# Altium footprint library Semicon-Discrete.pcblib: 205 footprints (part 4 of 13)
Each footprint in its own frame and in the unit in brackets; x right, y up, seen from the top. Pads: shape width x height; smd on the part's side, far side on the other; paste and mask are expansions set on the pad; w line width, h text height; cw(c..) or ccw(c..) is an arc to the next point about the centre after c.
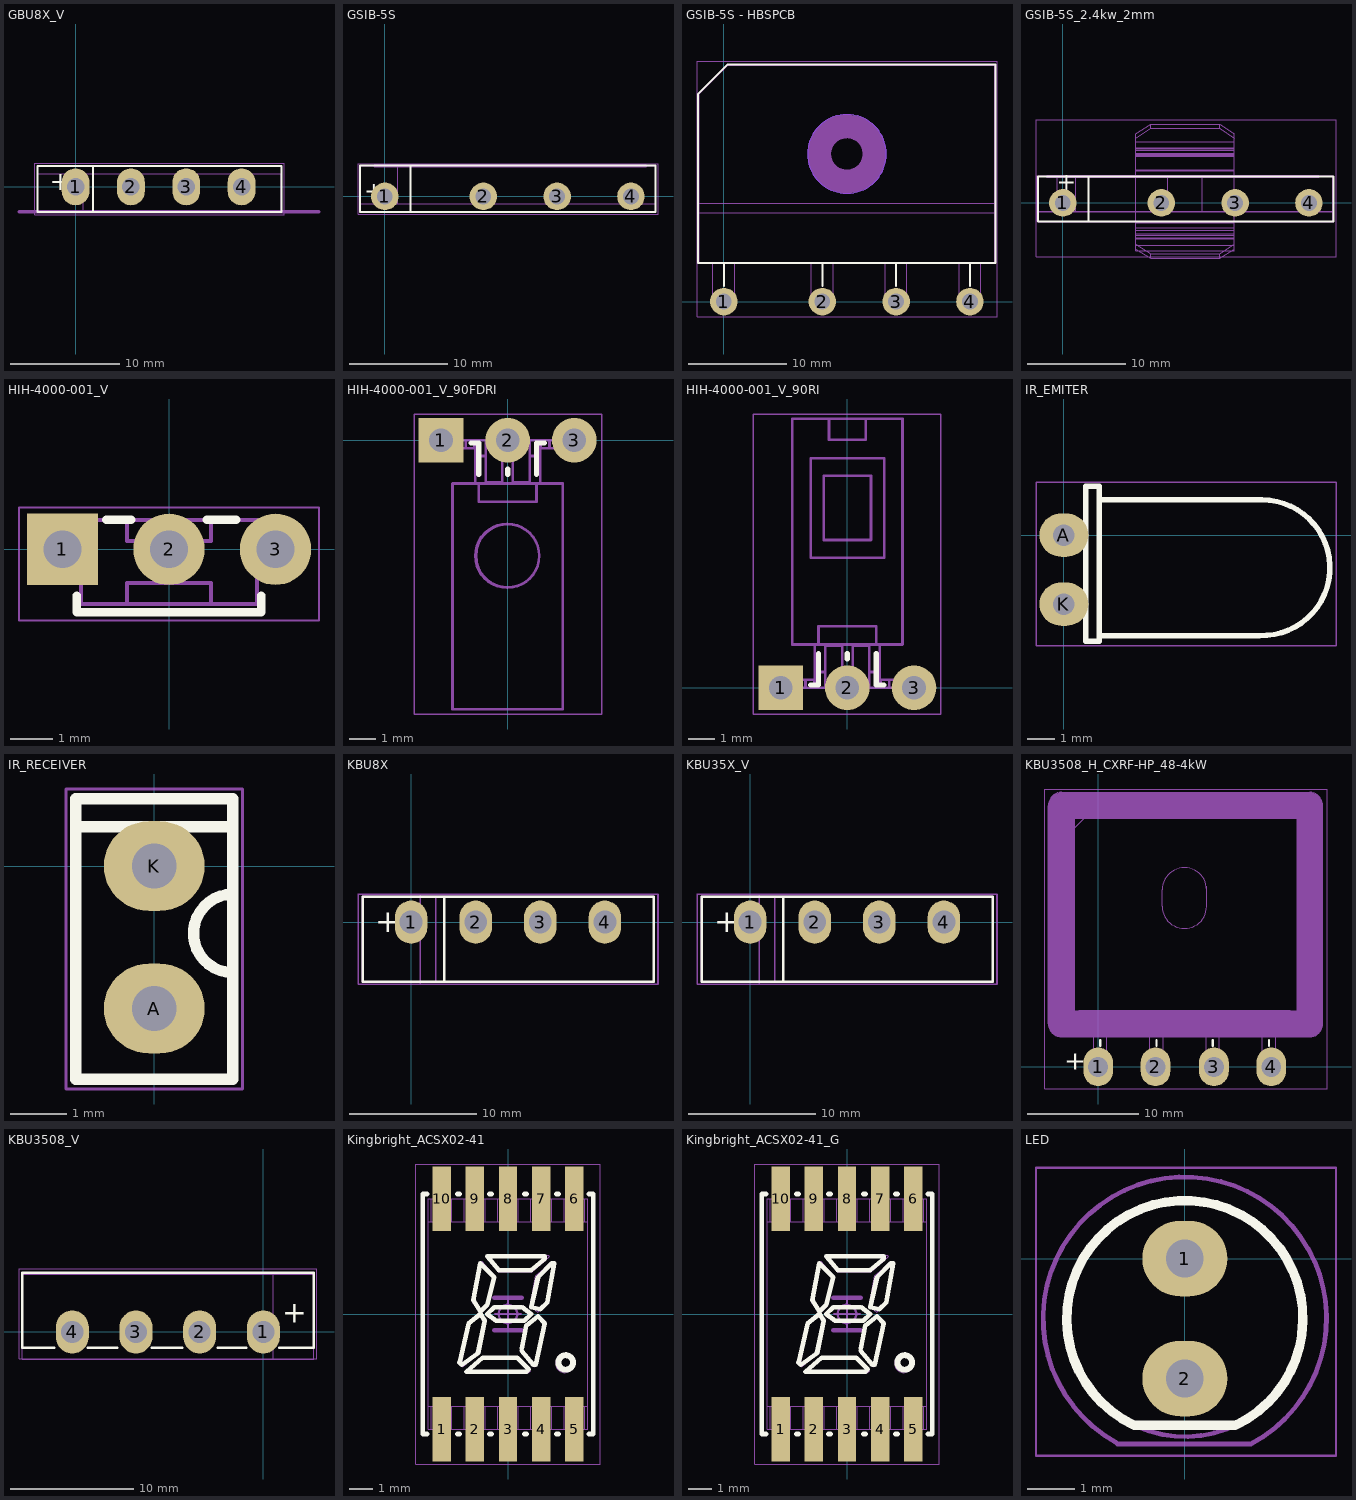
[diagram p3: the footprints below, top view; thin cyan lines are the x and y axes]

## GBU8X_V [mm]
height 20
pads (4):
  oval 2.55x3.4 hole 1.6: 1(0,0) 2(5.08,0) 3(10.16,0) 4(15.24,0)
TopOverlay:
  lines w0.2: 1.6,-2.3 1.6,1.8 ; -3.5,-2.3 -3.5,1.9 18.9,1.9 18.9,-2.3 -3.5,-2.3
  text "+" at -2.375,-0.925 h3
2-TopCompOutl:
  lines w0.1: 0.7,-2.3 0.7,1.2 ; -3.5,-2.3 18.9,-2.3 18.9,1.2 -3.5,1.2 -3.5,-2.3
4-TopCourty:
  circle w0.1: c0,0 r0.35
  lines w0.05: -3.75,-2.55 19.15,-2.55 19.15,2.15 -3.75,2.15 -3.75,-2.55
  lines w0.1: -0.525,0 0.525,0 ; 0,-0.525 0,0.525
5-MCadOutl:
  lines w0.3: -5.2,-2.3 22.35,-2.3
  text "heatsink side" at 2.8,-4.1 h2
7-TopAssy:
  lines w0.1: 0.7,-2.3 0.7,1.2 ; -3.5,-2.3 18.9,-2.3 18.9,1.2 -3.5,1.2 -3.5,-2.3 ; -0.4,-0.2 0.4,-0.2 0.4,0.2 -0.4,0.2 -0.4,-0.2 ; 4.68,-0.2 4.68,0.2 5.48,0.2 5.48,-0.2 4.68,-0.2 ; 9.76,-0.2 9.76,0.2 10.56,0.2 10.56,-0.2 9.76,-0.2 ; 14.84,-0.2 14.84,0.2 15.64,0.2 15.64,-0.2 14.84,-0.2
  text "+" at -2.375,-0.925 h3
  text ".Designator" at 2.325,2.225 h2.2
3D body "GBU8X_V.STEP": height 27.5, standoff -3, extent -3.575,-2.325 18.725,1.335

## GSIB-5S [mm]
pads (4):
  round 2.8 hole 1.6: 1(0,0) 2(10,0) 3(17.5,0) 4(25,0)
TopOverlay:
  lines w0.2: 2.6,-1.6 2.6,3.1 ; -2.5,-1.6 -2.5,3.125 27.5,3.125 27.5,-1.6 -2.5,-1.6
  text "+" at -2.075,-0.9 h3
2-TopCompOutl:
  lines w0.1: -2.5,-0.75 27.5,-0.75 27.5,-0.575 ; 1.3,-0.75 1.3,3.125 ; -2.5,-1.575 27.5,-1.575 27.5,3.125 -2.5,3.125 -2.5,0.425 -2.5,-1.575
4-TopCourty:
  circle w0.1: c0,0 r0.35
  lines w0.05: -2.725,-1.825 -2.725,3.325 27.75,3.325 27.75,-1.825 -2.725,-1.825
  lines w0.1: -0.525,0 0.525,0 ; 0,-0.525 0,0.525
5-MCadOutl:
  lines w0.3: -1.025,3.1 26.525,3.1
  text "heatsink side" at 18.525,4.9 h2
7-TopAssy:
  circle w0.1: c25,0 r0.6
  circle w0.1: c17.5,0 r0.6
  circle w0.1: c10,0 r0.6
  circle w0.1: c0,0 r0.6
  lines w0.1: -2.5,-0.75 27.5,-0.75 27.5,-1 ; 1.3,-0.725 1.3,3.125 ; -2.5,-1.6 27.5,-1.6 27.5,3.125 -2.5,3.125 -2.5,0 -2.5,-1.6
  text ".Designator" at 1.825,0.875 h1.8
  text "+" at -1.9,0.45 h3
3D body "GSIB-5S.STEP": height 24, standoff -3.2, extent -2.4,-1.5 27.6,3.1

## GSIB-5S - HBSPCB [mm] "Bridge 15A 800V Horisontaly mounted on the back side of the PCB"
height 6.4
pads (4):
  round 2.8 hole 1.6: 1(0,0) 2(10,0) 3(17.5,0) 4(25,0)
TopLayer keep-out:
  circle w0.1: c12.5,15 r4
BottomLayer keep-out:
  circle w0.1: c12.5,15 r4
TopOverlay:
  lines w0.2: 0,1.6 0,3.9 ; 10,1.6 10,3.9 ; 17.5,1.6 17.5,3.9 ; 25,1.6 25,3.9 ; -2.6,3.9 27.6,3.9 27.6,24.1 0.4,24.1 -2.6,21.1 -2.6,3.9
1-RoutNonPlating:
  circle w2.4: c12.5,15 r2.8
2-TopCompOutl:
  circle w0.1: c12.5,15 r1.8
  lines w0.1: -2.5,9 27.5,9 ; -2.5,10 27.5,10 ; -1.1,4 -1.1,0 -0.5,0 ; 0.5,0 1.1,0 1.1,4 ; 8.9,4 8.9,0 9.5,0 ; 10.5,0 11.1,0 11.1,4 ; 16.4,4 16.4,0 17,0 ; 18,0 18.6,0 18.6,4 ; 23.9,4 23.9,0 24.5,0 ; 25.5,0 26.1,0 26.1,4 ; -2.5,4 -2.5,21.1 0.4,24 27.5,24 27.5,4 0,4 -2.5,4 ; -0.5,-0.3 0.5,-0.3 0.5,0.3 -0.5,0.3 -0.5,-0.3 ; 9.5,-0.3 10.5,-0.3 10.5,0.3 9.5,0.3 9.5,-0.3 ; 17,-0.3 18,-0.3 18,0.3 17,0.3 17,-0.3 ; 24.5,-0.3 25.5,-0.3 25.5,0.3 24.5,0.3 24.5,-0.3
4-TopCourty:
  circle w0.1: c0,0 r0.35
  lines w0.05: -2.725,-1.55 -2.725,24.425 27.75,24.425 27.75,-1.55 -2.725,-1.55
  lines w0.1: -0.525,0 0.525,0 ; 0,-0.525 0,0.525
7-TopAssy:
  circle w0.1: c12.5,15 r1.8
  lines w0.1: -2.5,9 27.5,9 ; -2.5,10 27.5,10 ; -1.1,4 -1.1,0 -0.5,0 ; 0.5,0 1.1,0 1.1,4 ; 8.9,4 8.9,0 9.5,0 ; 10.5,0 11.1,0 11.1,4 ; 16.4,4 16.4,0 17,0 ; 18,0 18.6,0 18.6,4 ; 23.9,4 23.9,0 24.5,0 ; 25.5,0 26.1,0 26.1,4 ; -2.5,4 0,4 27.5,4 27.5,24 0.4,24 -2.5,21.1 -2.5,4 ; -0.5,-0.3 -0.5,0.3 0.5,0.3 0.5,-0.3 -0.5,-0.3 ; 9.5,-0.3 9.5,0.3 10.5,0.3 10.5,-0.3 9.5,-0.3 ; 17,-0.3 17,0.3 18,0.3 18,-0.3 17,-0.3 ; 24.5,-0.3 24.5,0.3 25.5,0.3 25.5,-0.3 24.5,-0.3
  text ".Designator" at 6.775,6.125 h2.2
16-Mechanical16:
  circle w0.1: c0,0 r0.7
  circle w0.1: c10,0 r0.7
  circle w0.1: c17.5,0 r0.7
  circle w0.1: c25,0 r0.7
  circle w0.1: c12.5,15 r4

## GSIB-5S_2.4kw_2mm [mm] "GSIB-5S_2.4kw_2mm"
pads (4):
  round 2.8 hole 1.6: 1(0,0) 2(10,0) 3(17.5,0) 4(25,0)
TopOverlay:
  lines w0.2: 2.6,-1.9 2.6,2.7 ; -2.5,-1.9 -2.5,2.7 27.5,2.7 27.5,-1.9 -2.5,-1.9
  text "+" at -0.625,0.65 h3
2-TopCompOutl:
  lines w0.1: -2.5,-0.9 27.5,-0.9 27.5,-1 ; 1.3,-0.9 1.3,2.7 ; -2.5,-1.9 27.5,-1.9 27.5,2.7 -2.5,2.7 -2.5,0 -2.5,-1.9
4-TopCourty:
  circle w0.1: c0,0 r0.35
  lines w0.05: -2.725,-5.45 -2.725,8.45 27.75,8.45 27.75,-5.45 -2.725,-5.45
  lines w0.1: -0.525,0 0.525,0 ; 0,-0.525 0,0.525
5-MCadOutl:
  drawing of 195 lines, arcs and shapes, not listed
  text "heatsink side" at 28.025,4.275 h2
7-TopAssy:
  circle w0.1: c25,0 r0.6
  circle w0.1: c17.5,0 r0.6
  circle w0.1: c10,0 r0.6
  circle w0.1: c0,0 r0.6
  lines w0.1: -2.5,-0.9 27.5,-0.9 27.5,-1 ; 1.3,-0.9 1.3,2.7 ; -2.5,-1.9 27.5,-1.9 27.5,2.7 -2.5,2.7 -2.5,0 -2.5,-1.9
  text "+" at -0.65,0.675 h3
  text ".Designator" at 2.525,0.3 h2.2
3D body "GSIB-5S_2.4kw_2mm.STEP": height 29.51, standoff -3.2, extent -2.5,-5.34 27.5,8.3

## HIH-4000-001_V [mm] "Snsr, Humdy Cap, 100%, SIL, Verticall"
height 13
pads (3):
  rect 1.7x1.7 hole 0.9: 1(-2.54,0)
  round 1.7 hole 0.9: 2(0,0) 3(2.54,0)
TopOverlay:
  lines w0.2: -2.2,-1.1 -2.2,-1.5 2.2,-1.5 2.2,-1.1 ; -1.5,0.7 -0.9,0.7 ; 0.9,0.7 1.6,0.7
2-TopCompOutl:
  lines w0.1: -2.1,-0.2 -2.7,-0.2 -2.7,0.2 -2.1,0.2 ; -1,-1.3 -1,-0.8 1,-0.8 1,-1.3 ; -1,0.7 -1,0.2 1,0.2 1,0.7 ; 2.1,-0.2 2.7,-0.2 2.7,0.2 2.1,0.2 ; -2.1,-1.3 -2.1,0.7 2.1,0.7 2.1,-1.3 -2.1,-1.3
4-TopCourty:
  circle w0.1: c0,0 r0.35
  lines w0.05: -3.575,-1.7 -3.575,1 3.575,1 3.575,-1.7 -3.575,-1.7
  lines w0.1: -0.525,0 0.525,0 ; 0,-0.525 0,0.525
7-TopAssy:
  lines w0.1: -2.1,-0.2 -2.7,-0.2 -2.7,0.2 -2.1,0.2 ; -1,-1.3 -1,-0.8 1,-0.8 1,-1.3 ; -1,0.7 -1,0.2 1,0.2 1,0.7 ; 2.1,-0.2 2.7,-0.2 2.7,0.2 2.1,0.2 ; -2.1,-1.3 -2.1,0.7 2.1,0.7 2.1,-1.3 -2.1,-1.3
  text ".Designator" at -1.75,1.025 h2.2

## HIH-4000-001_V_90FDRI [mm] "Snsr, Humdy Cap, 100%, SIL, Horizontally Mounted"
height 13
pads (3):
  rect 1.7x1.7 hole 0.9: 1(-2.54,0)
  round 1.7 hole 0.9: 2(0,0) 3(2.54,0)
TopOverlay:
  lines w0.2: -1.4,-0.1 -1.1,-0.1 -1.1,-1.3 ; 0,-1.3 0,-1.1 ; 1.1,-1.3 1.1,-0.1 1.4,-0.1
2-TopCompOutl:
  circle w0.1: c-0.017,-4.4 r1.217
  lines w0.1: -1.24,-1.647 -1.24,-0.6 ; -1.24,-0.345 -1.253,-0.312 -1.266,-0.3 ; 1.24,-1.647 1.24,-0.6 ; 1.24,-0.345 1.253,-0.312 1.266,-0.3 ; -2.389,-0.3 -2.74,-0.3 -2.74,0 -2.389,0 ; -2.389,-0.3 -1.591,-0.3 ; -2.389,-0.3 -2.389,0 ; -2.389,0 -1.591,0 ; -1.591,-0.3 -1.591,0 ; -1.591,-0.3 -1.266,-0.3 ; -1.591,0 -1.266,0 ; -1.266,-0.3 -1.266,0 ; -1.266,0 cw(c-1.394,-0.086) -1.24,-0.091 -1.24,-0.6 ; -1.266,0 -0.843,0 -0.84,-0.011 -0.84,-0.6 ; -1.24,-0.6 -0.84,-0.6 ; -1.1,-1.647 1.1,-1.647 ; -1.1,-1.647 -1.1,-2.347 1.1,-2.347 1.1,-1.647 ; -1.1,-1.647 -2.1,-1.647 -2.1,-10.247 0.7,-10.247 2.1,-10.247 2.1,-1.647 1.1,-1.647 ; -0.84,-0.6 -0.84,-1.597 -0.2,-1.597 -0.2,-0.6 ; -0.2,-0.6 -0.2,0 0.2,0 0.2,-0.6 ; -0.2,-0.6 0.2,-0.6 ; 0.2,-0.6 0.2,-1.597 0.84,-1.597 0.84,-0.6 ; 0.84,-0.6 0.84,-0.011 0.843,0 1.266,0 ; 0.84,-0.6 1.24,-0.6 ; 1.24,-0.6 1.24,-0.091 cw(c1.394,-0.086) 1.266,0 ; 1.266,-0.3 1.591,-0.3 ; 1.266,-0.3 1.266,0 ; 1.266,0 1.591,0 ; 1.591,-0.3 2.389,-0.3 ; 1.591,-0.3 1.591,0 ; 1.591,0 2.389,0 ; 2.389,-0.3 2.74,-0.3 2.74,0 2.389,0 ; 2.389,-0.3 2.389,0
4-TopCourty:
  circle w0.1: c0,0 r0.35
  lines w0.05: -3.55,-10.425 -3.55,1 3.575,1 3.575,-10.425 -3.55,-10.425
  lines w0.1: -0.525,0 0.525,0 ; 0,-0.525 0,0.525
7-TopAssy:
  circle w0.1: c0,-4.4 r1.204
  lines w0.1: -1.24,-1.647 -1.24,-0.6 ; -1.24,-0.345 -1.253,-0.312 -1.266,-0.3 ; 1.24,-1.647 1.24,-0.6 ; 1.24,-0.345 1.253,-0.312 1.266,-0.3 ; -2.389,-0.3 -2.74,-0.3 -2.74,0 -2.389,0 ; -2.389,-0.3 -1.591,-0.3 ; -2.389,-0.3 -2.389,0 ; -2.389,0 -1.591,0 ; -1.591,-0.3 -1.591,0 ; -1.591,-0.3 -1.266,-0.3 ; -1.591,0 -1.266,0 ; -1.266,-0.3 -1.266,0 ; -1.266,0 cw(c-1.394,-0.086) -1.24,-0.091 -1.24,-0.6 ; -1.266,0 -0.843,0 -0.84,-0.011 -0.84,-0.6 ; -1.24,-0.6 -0.84,-0.6 ; -1.1,-1.647 1.1,-1.647 ; -1.1,-1.647 -1.1,-2.347 1.1,-2.347 1.1,-1.647 ; -1.1,-1.647 -2.1,-1.647 -2.1,-10.247 0.7,-10.247 2.1,-10.247 2.1,-1.647 1.1,-1.647 ; -0.84,-0.6 -0.84,-1.597 -0.2,-1.597 -0.2,-0.6 ; -0.2,-0.6 -0.2,0 0.2,0 0.2,-0.6 ; -0.2,-0.6 0.2,-0.6 ; 0.2,-0.6 0.2,-1.597 0.84,-1.597 0.84,-0.6 ; 0.84,-0.6 0.84,-0.011 0.843,0 1.266,0 ; 0.84,-0.6 1.24,-0.6 ; 1.24,-0.6 1.24,-0.091 cw(c1.394,-0.086) 1.266,0 ; 1.266,-0.3 1.591,-0.3 ; 1.266,-0.3 1.266,0 ; 1.266,0 1.591,0 ; 1.591,-0.3 2.389,-0.3 ; 1.591,-0.3 1.591,0 ; 1.591,0 2.389,0 ; 2.389,-0.3 2.74,-0.3 2.74,0 2.389,0 ; 2.389,-0.3 2.389,0
  text ".Designator" at -1.125,0.975 h2.2

## HIH-4000-001_V_90RI [mm] "Snsr, Humdy Cap, 100%, SIL, Horizontally Mounted"
height 13
pads (3):
  rect 1.7x1.7 hole 0.9: 1(-2.54,0)
  round 1.7 hole 0.9: 2(0,0) 3(2.54,0)
TopOverlay:
  lines w0.2: -1.4,0.1 -1.1,0.1 -1.1,1.3 ; 0,1.1 0,1.3 ; 1.1,1.3 1.1,0.1 1.4,0.1
2-TopCompOutl:
  lines w0.1: -1.24,0.345 -1.253,0.312 -1.266,0.3 ; -1.24,1.647 -1.24,0.6 ; 1.24,0.345 1.253,0.312 1.266,0.3 ; 1.24,1.647 1.24,0.6 ; -2.389,0 -2.389,0.3 ; -2.389,0 -1.591,0 ; -2.389,0 -2.74,0 -2.74,0.3 -2.389,0.3 ; -2.389,0.3 -1.591,0.3 ; -1.591,0 -1.266,0 ; -1.591,0 -1.591,0.3 ; -1.591,0.3 -1.266,0.3 ; -1.266,0 ccw(c-1.394,0.086) -1.24,0.091 -1.24,0.6 ; -1.266,0 -0.843,0 -0.84,0.011 -0.84,0.6 ; -1.266,0 -1.266,0.3 ; -1.24,0.6 -0.84,0.6 ; -1.1,1.647 -2.1,1.647 -2.1,10.247 -0.7,10.247 ; -1.1,1.647 -1.1,2.347 1.1,2.347 1.1,1.647 ; -1.1,1.647 1.1,1.647 ; -0.84,0.6 -0.84,1.597 -0.2,1.597 -0.2,0.6 ; -0.7,10.247 -0.7,9.447 0.7,9.447 0.7,10.247 ; -0.7,10.247 0.7,10.247 ; -0.2,0.6 0.2,0.6 ; -0.2,0.6 -0.2,0 0.2,0 0.2,0.6 ; 0.2,0.6 0.2,1.597 0.84,1.597 0.84,0.6 ; 0.7,10.247 2.1,10.247 2.1,1.647 1.1,1.647 ; 0.84,0.6 0.84,0.011 0.843,0 1.266,0 ; 0.84,0.6 1.24,0.6 ; 1.24,0.6 1.24,0.091 ccw(c1.394,0.086) 1.266,0 ; 1.266,0 1.266,0.3 ; 1.266,0 1.591,0 ; 1.266,0.3 1.591,0.3 ; 1.591,0 1.591,0.3 ; 1.591,0 2.389,0 ; 1.591,0.3 2.389,0.3 ; 2.389,0 2.389,0.3 ; 2.389,0 2.74,0 2.74,0.3 2.389,0.3 ; -1.4,4.947 1.4,4.947 1.4,8.747 -1.4,8.747 -1.4,4.947 ; -0.9,5.625 0.9,5.625 0.9,8.068 -0.9,8.068 -0.9,5.625
4-TopCourty:
  circle w0.1: c0,0 r0.35
  lines w0.05: -3.575,-1 -3.575,10.425 3.55,10.425 3.55,-1 -3.575,-1
  lines w0.1: -0.525,0 0.525,0 ; 0,-0.525 0,0.525
7-TopAssy:
  lines w0.1: -1.24,0.345 -1.253,0.312 -1.266,0.3 ; -1.24,1.647 -1.24,0.6 ; 1.24,0.345 1.253,0.312 1.266,0.3 ; 1.24,1.647 1.24,0.6 ; -2.389,0 -2.389,0.3 ; -2.389,0 -1.591,0 ; -2.389,0 -2.74,0 -2.74,0.3 -2.389,0.3 ; -2.389,0.3 -1.591,0.3 ; -1.591,0 -1.266,0 ; -1.591,0 -1.591,0.3 ; -1.591,0.3 -1.266,0.3 ; -1.266,0 ccw(c-1.394,0.086) -1.24,0.091 -1.24,0.6 ; -1.266,0 -0.843,0 -0.84,0.011 -0.84,0.6 ; -1.266,0 -1.266,0.3 ; -1.24,0.6 -0.84,0.6 ; -1.1,1.647 -2.1,1.647 -2.1,10.247 -0.7,10.247 ; -1.1,1.647 -1.1,2.347 1.1,2.347 1.1,1.647 ; -1.1,1.647 1.1,1.647 ; -0.84,0.6 -0.84,1.597 -0.2,1.597 -0.2,0.6 ; -0.7,10.247 -0.7,9.447 0.7,9.447 0.7,10.247 ; -0.7,10.247 0.7,10.247 ; -0.2,0.6 0.2,0.6 ; -0.2,0.6 -0.2,0 0.2,0 0.2,0.6 ; 0.2,0.6 0.2,1.597 0.84,1.597 0.84,0.6 ; 0.7,10.247 2.1,10.247 2.1,1.647 1.1,1.647 ; 0.84,0.6 0.84,0.011 0.843,0 1.266,0 ; 0.84,0.6 1.24,0.6 ; 1.24,0.6 1.24,0.091 ccw(c1.394,0.086) 1.266,0 ; 1.266,0 1.266,0.3 ; 1.266,0 1.591,0 ; 1.266,0.3 1.591,0.3 ; 1.591,0 1.591,0.3 ; 1.591,0 2.389,0 ; 1.591,0.3 2.389,0.3 ; 2.389,0 2.389,0.3 ; 2.389,0 2.74,0 2.74,0.3 2.389,0.3 ; -1.4,4.947 1.4,4.947 1.4,8.747 -1.4,8.747 -1.4,4.947 ; -0.9,5.625 0.9,5.625 0.9,8.068 -0.9,8.068 -0.9,5.625
  text ".Designator" at -1.65,3.025 h2.2

## IR_EMITER [mm]
pads (2):
  oval 1.8x1.6 hole 0.8: A(0,0) K(0,-2.54)
TopOverlay:
  lines w0.2: 0.8,-2.8 -0.2,-2.8 -0.2,-2.2 0.8,-2.2 ; 0.8,-0.3 -0.2,-0.3 -0.2,0.4 -0.1,0.4 0.8,0.4 ; 1.3,1.3 7.3,1.3 cw(c7.3,-1.2) 7.2,-3.698 6.4,-3.698 ; 6.4,-3.7 1.3,-3.7 ; 1.3,-3.7 1.3,-3.9 0.8,-3.9 0.8,1.8 1.3,1.8 1.3,-3.7
4-TopCourty:
  circle w0.1: c0,0 r0.35
  lines w0.05: -1.025,-4.075 -1.025,1.95 10.025,1.95 10.025,-4.075 -1.025,-4.075
  lines w0.1: -0.525,0 0.525,0 ; 0,-0.525 0,0.525
7-TopAssy:
  lines w0.1: 0.8,-2.8 -0.2,-2.8 -0.2,-2.2 0.8,-2.2 ; 0.8,-0.3 -0.2,-0.3 -0.2,0.4 -0.1,0.4 0.8,0.4 ; 1.3,1.3 7.3,1.3 cw(c7.3,-1.2) 7.2,-3.698 6.4,-3.698 ; 6.4,-3.7 1.3,-3.7 ; 1.3,-3.7 1.3,-3.9 0.8,-3.9 0.8,-3.7 0.8,-3.6 0.8,1.8 1.3,1.8 1.3,-3.7
  text ".Designator" at 2.175,-1.825 h2.2

## IR_RECEIVER [mm]
pads (2):
  oval 1.8x1.6 hole 0.8: A(0,-2.54) K(0,0)
TopOverlay:
  lines w0.2: -1.4,0.7 1.4,0.7 ; 1.4,-1.9 cw(c1.4,-1.2) 1.4,-0.5 ; -1.4,-3.8 -1.4,1.2 1.4,1.2 1.4,-3.8 -1.4,-3.8
4-TopCourty:
  circle w0.1: c0,0 r0.35
  lines w0.05: -1.575,-3.975 1.575,-3.975 1.575,1.375 -1.575,1.375 -1.575,-3.975
  lines w0.1: -0.525,0 0.525,0 ; 0,-0.525 0,0.525
7-TopAssy:
  lines w0.1: -1.4,0.7 1.4,0.7 ; 1.4,-1.9 cw(c1.4,-1.2) 1.4,-0.5 ; -1.4,-3.8 1.4,-3.8 1.4,1.2 -1.4,1.2 -1.4,-3.8
  text ".Designator" at -1.3,1.55 h2.2

## KBU8X [mm]
height 20
pads (4):
  oval 2.55x3.4 hole 1.8: 1(0,0) 2(5.08,0) 3(10.16,0) 4(15.24,0)
TopOverlay:
  lines w0.2: 2.6,-4.7 2.6,2 ; -3.8,-4.7 19.1,-4.7 19.1,2 -3.8,2 -3.8,-4.7
  text "+" at -2.825,-1.4 h3
2-TopCompOutl:
  lines w0.1: 0.7,-4.9 0.7,2.2 ; -4.18,-4.9 19.42,-4.9 19.42,2.2 -4.18,2.2 -4.18,-4.9
4-TopCourty:
  circle w0.1: c0,0 r0.35
  lines w0.05: -4.175,-4.9 19.4,-4.9 19.4,2.25 -4.175,2.25 -4.175,-4.9
  lines w0.1: -0.525,0 0.525,0 ; 0,-0.525 0,0.525
7-TopAssy:
  lines w0.1: 1.925,-4.7 1.925,2.025 2,2.025 ; -3.85,-4.7 19.1,-4.7 19.1,2.05 -3.85,2.05 -3.85,-4.7
  text ".Designator" at 4.05,-3.475 h2.2
  text "+" at -2.825,-1.4 h3

## KBU35X_V [mm]
height 20
pads (4):
  oval 2.55x3.4 hole 1.8: 1(0,0) 2(5.08,0) 3(10.16,0) 4(15.24,0)
TopOverlay:
  lines w0.2: 2.6,-4.7 2.6,2 ; -3.8,-4.7 -3.8,2 19.1,2 19.1,-4.7 -3.8,-4.7
  text "+" at -2.825,-1.4 h3
2-TopCompOutl:
  lines w0.1: 0.7,-4.9 0.7,2.2 ; -4.18,-4.9 -4.18,2.2 19.42,2.2 19.42,-4.9 -4.18,-4.9
4-TopCourty:
  circle w0.1: c0,0 r0.35
  lines w0.05: -4.175,-4.9 -4.175,2.25 19.4,2.25 19.4,-4.9 -4.175,-4.9
  lines w0.1: -0.525,0 0.525,0 ; 0,-0.525 0,0.525
7-TopAssy:
  lines w0.1: 1.925,-4.7 1.925,2.025 2,2.025 ; -3.85,-4.7 -3.85,2.05 19.1,2.05 19.1,-4.7 -3.85,-4.7
  text "+" at -2.825,-1.4 h3
  text ".Designator" at 4.05,-3.475 h2.2
3D body "KBU35X_V.STEP": height 26, standoff -3.2, extent -4.23,-4.9 19.47,2.3

## KBU3508_H_CXRF-HP_48-4kW [mm]
height 6
pads (4):
  oval 2.68x3.5 hole 1.8: 1(0,0) 2(5.18,0) 3(10.46,0) 4(15.64,0)
TopOverlay:
  lines w0.2: 0.2,1.9 0.2,2.4 ; 5.28,1.9 5.28,2.4 ; 10.36,1.9 10.36,2.4 ; 15.44,1.9 15.44,2.4
  text "+" at -3.05,-0.85 h3
1-RoutNonPlating:
  lines w2.4: -3.3,3.9 -3.3,23.6 19.1,23.6 19.1,3.9 0.2,3.9 -3.3,3.9
2-TopCompOutl:
  lines w0.1: -0.4,5.1 -0.4,0 0.2,0 0.8,0 0.8,5.1 ; 4.68,5.1 4.68,0 5.28,0 5.88,0 5.88,5.1 ; 9.76,5.1 9.76,0 10.36,0 10.96,0 10.96,5.1 ; 9.8,16 ccw(c7.8,16) 5.8,16 5.8,14.5 ccw(c7.8,14.5) 9.8,14.5 9.8,16.3 ; 14.84,5.1 14.84,0 15.44,0 16.04,0 16.04,5.1 ; -3.9,3.4 -3.9,5 -3.9,19.8 -0.9,22.8 19.5,22.8 19.5,5 19.5,3.4 19,3.4 17.3,5.1 -1.7,5.1 -3.4,3.4 -3.9,3.4
4-TopCourty:
  circle w0.1: c0,0 r0.35
  lines w0.05: -4.8,-2 -4.8,25.1 20.675,25.1 20.675,-2 -4.8,-2
  lines w0.1: -0.525,0 0.525,0 ; 0,-0.525 0,0.525
7-TopAssy:
  lines w0.1: -0.4,5.1 -0.4,0 0.2,0 0.8,0 0.8,5.1 ; 4.68,5.1 4.68,0 5.28,0 5.88,0 5.88,5.1 ; 9.76,5.1 9.76,0 10.36,0 10.96,0 10.96,5.1 ; 9.8,16 ccw(c7.8,16) 5.8,16 5.8,14.5 ccw(c7.8,14.5) 9.8,14.5 9.8,16.3 ; 14.84,5.1 14.84,0 15.44,0 16.04,0 16.04,5.1 ; -3.9,3.4 -3.9,5 -3.9,19.8 -0.9,22.8 19.5,22.8 19.5,5 19.5,3.4 19,3.4 17.3,5.1 -1.7,5.1 -3.4,3.4 -3.9,3.4
  text "+" at -3.05,-0.875 h3
  text ".Designator" at 2.95,9.45 h2.2
12-PcbOutl:
  lines w0.1: -4.5,3.9 ccw(c-3.3,3.9) -3.3,2.7 19.1,2.7 ccw(c19.1,3.9) 20.3,3.9 20.3,23.6 ccw(c19.1,23.6) 19.1,24.8 -3.3,24.8 ccw(c-3.3,23.6) -4.5,23.6 -4.5,3.9

## KBU3508_V [mm]
height 30
pads (4):
  oval 2.68x3.5 hole 1.8: 1(0,0) 2(-5.18,0) 3(-10.36,0) 4(-15.54,0)
TopOverlay:
  lines w0.2: -17,-1.3 -19.6,-1.3 -19.6,4.8 4.1,4.8 4.1,-1.1 4.1,-1.3 1.3,-1.3 ; -14.3,-1.3 -11.9,-1.3 ; -9.1,-1.3 -6.6,-1.3 ; -3.7,-1.3 -1.4,-1.3
  text "+" at 1.525,0.125 h3
2-TopCompOutl:
  lines w0.1: 0.8,-2.2 0.8,4.7 ; -19.6,-2.2 4.1,-2.2 4.1,4.7 -19.6,4.7 -19.6,-2.2
4-TopCourty:
  circle w0.1: c0,0 r0.35
  lines w0.05: -19.875,-2.175 -19.875,5.125 4.325,5.125 4.325,-2.175 -19.875,-2.175
  lines w0.1: -0.525,0 0.525,0 ; 0,-0.525 0,0.525
7-TopAssy:
  lines w0.1: 0.8,-2.2 0.8,4.7 ; -19.6,-2.2 4.1,-2.2 4.1,4.7 -19.6,4.7 -19.6,-2.2
  text "+" at 1.475,-1.1 h3
  text ".Designator" at -3.825,3.925 h2.2

## Kingbright_ACSX02-41 [mm] "Kingbright, SMD 1 Digit, 7 Segment Display, RED"
height 4
pads (10):
  rect 0.8x2.8 smd: 1(-2.88,-5) 2(-1.44,-5) 3(0,-5) 4(1.44,-5) 5(2.88,-5) 6(2.88,5) 7(1.44,5) 8(0,5) 9(-1.44,5) 10(-2.88,5)
TopOverlay:
  circle w0.254: c2.5,-2.1 r0.316
  lines w0.2: -3.5,-5.2 -3.7,-5.2 -3.7,0 -3.7,5.2 -3.5,5.2 ; -2.2,-5.2 -2.1,-5.2 ; -2.2,5.2 -2.1,5.2 ; -0.8,-5.2 -0.7,-5.2 ; -0.8,5.2 -0.7,5.2 ; 0.6,-1.6 1.1,-2.2 1.2,-2.2 1.6,-0.4 1.3,-0.1 0.8,-0.5 0.6,-1.5 ; 0.7,-5.2 0.8,-5.2 ; 0.7,5.2 0.8,5.2 ; 2.1,-5.2 2.2,-5.2 ; 2.1,5.2 2.2,5.2 ; 3.5,-5.2 3.7,-5.2 3.7,0 3.7,5.2 3.5,5.2 ; -2.1,-2.1 -1.7,-0.4 -1.2,0 -1,-0.3 -1.3,-1.7 -2,-2.2 -2.1,-2.1 ; -1.8,-2.5 -1.1,-1.9 0.4,-1.9 0.9,-2.4 0.8,-2.5 -1.8,-2.5 ; -1.5,0.6 -1.2,0.1 -0.9,0.4 -0.6,1.6 -1.2,2.2 -1.5,0.6 ; -0.9,0 -0.6,0.3 0.6,0.3 1,0 0.7,-0.3 -0.5,-0.3 -0.9,0 ; -0.9,2.5 -0.4,1.9 1,1.9 1.6,2.4 1.6,2.5 -0.9,2.5 ; 1,0.3 1.3,1.6 1.9,2.2 2,2.2 1.7,0.5 1.4,0.2 1,0.3
2-TopCompOutl:
  circle w0.05: c2.462,-2.14 r0.4
  lines w0.05: -3.33,-4 -3.33,-5 ; -3.33,4 -3.33,5 ; -2.43,-4 -2.43,-5 ; -2.43,4 -2.43,5 ; -1.89,-4 -1.89,-5 ; -1.89,4 -1.89,5 ; -0.99,-4 -0.99,-5 ; -0.99,4 -0.99,5 ; -0.45,-4 -0.45,-5 ; -0.45,4 -0.45,5 ; 0.45,-4 0.45,-5 ; 0.45,4 0.45,5 ; 0.99,-4 0.99,-5 ; 0.99,4 0.99,5 ; 1.89,-4 1.89,-5 ; 1.89,4 1.89,5 ; 2.43,-4 2.43,-5 ; 2.43,4 2.43,5 ; 3.33,-4 3.33,-5 ; 3.33,4 3.33,5 ; -3.45,-4 3.45,-4 ; -3.45,-4 -3.45,4 ; -3.45,-4 -3.45,-5 -3.33,-5 ; -3.45,4 3.45,4 ; -3.45,4 -3.45,5 -3.33,5 ; -3.33,-5 -3.205,-5 cw(c-2.88,-5) -2.555,-5 -2.43,-5 ; -3.33,5 -3.205,5 ccw(c-2.88,5) -2.555,5 -2.43,5 ; -2.43,-5 -1.89,-5 ; -2.43,5 -1.89,5 ; -1.89,-5 -1.765,-5 cw(c-1.44,-5) -1.115,-5 -0.99,-5 ; -1.89,5 -1.765,5 ccw(c-1.44,5) -1.115,5 -0.99,5 ; -0.99,-5 -0.45,-5 ; -0.99,5 -0.45,5 ; -0.45,-5 -0.325,-5 cw(c0,-5) 0.325,-5 0.45,-5 ; -0.45,5 -0.325,5 ccw(c0,5) 0.325,5 0.45,5 ; 0.45,-5 0.99,-5 ; 0.45,5 0.99,5 ; 0.99,-5 1.115,-5 cw(c1.44,-5) 1.765,-5 1.89,-5 ; 0.99,5 1.115,5 ccw(c1.44,5) 1.765,5 1.89,5 ; 1.89,-5 2.43,-5 ; 1.89,5 2.43,5 ; 2.43,-5 2.555,-5 cw(c2.88,-5) 3.205,-5 3.33,-5 ; 2.43,5 2.555,5 ccw(c2.88,5) 3.205,5 3.33,5 ; 3.33,-5 3.45,-5 3.45,-4 ; 3.33,5 3.45,5 3.45,4 ; 3.45,-4 3.45,4 ; -2.016,-2.222 -1.958,-2.28 -1.205,-1.648 -0.957,-0.245 -1.249,0 -1.69,-0.37 -2.016,-2.222 ; -1.78,-2.458 -1.044,-1.84 0.426,-1.84 0.955,-2.47 0.886,-2.54 -1.698,-2.54 -1.78,-2.458 ; -1.537,0.496 -1.144,0.089 -0.856,0.33 -0.618,1.679 -1.133,2.293 -1.239,2.186 -1.537,0.496 ; -0.955,2.47 -0.886,2.54 1.749,2.54 1.797,2.472 1.044,1.84 -0.426,1.84 -0.955,2.47 ; -0.938,0 -0.521,-0.35 0.645,-0.35 1.062,0 0.645,0.35 -0.521,0.35 -0.938,0 ; 0.618,-1.679 0.834,-0.452 1.251,-0.102 1.563,-0.35 1.239,-2.186 1.133,-2.293 0.618,-1.679 ; 0.973,0.335 1.205,1.648 1.941,2.266 2.008,2.171 1.717,0.524 1.283,0.076 0.973,0.335
4-TopCourty:
  circle w0.1: c0,0 r0.4
  lines w0.05: -4,-6.5 -4,6.5 4,6.5 4,-6.5 -4,-6.5
  lines w0.1: -0.55,0 0.55,0 ; 0,-0.575 0,0.575
7-TopAssy:
  circle w0.05: c2.462,-2.14 r0.4
  lines w0.05: -3.33,-4 -3.33,-5 ; -3.33,4 -3.33,5 ; -2.43,-4 -2.43,-5 ; -2.43,4 -2.43,5 ; -1.89,-4 -1.89,-5 ; -1.89,4 -1.89,5 ; -0.99,-4 -0.99,-5 ; -0.99,4 -0.99,5 ; -0.45,-4 -0.45,-5 ; -0.45,4 -0.45,5 ; 0.45,-4 0.45,-5 ; 0.45,4 0.45,5 ; 0.99,-4 0.99,-5 ; 0.99,4 0.99,5 ; 1.89,-4 1.89,-5 ; 1.89,4 1.89,5 ; 2.43,-4 2.43,-5 ; 2.43,4 2.43,5 ; 3.33,-4 3.33,-5 ; 3.33,4 3.33,5 ; -3.45,-4 3.45,-4 ; -3.45,-4 -3.45,4 ; -3.45,-4 -3.45,-5 -3.33,-5 ; -3.45,4 3.45,4 ; -3.45,4 -3.45,5 -3.33,5 ; -3.33,-5 -3.205,-5 cw(c-2.88,-5) -2.555,-5 -2.43,-5 ; -3.33,5 -3.205,5 ccw(c-2.88,5) -2.555,5 -2.43,5 ; -2.43,-5 -1.89,-5 ; -2.43,5 -1.89,5 ; -1.89,-5 -1.765,-5 cw(c-1.44,-5) -1.115,-5 -0.99,-5 ; -1.89,5 -1.765,5 ccw(c-1.44,5) -1.115,5 -0.99,5 ; -0.99,-5 -0.45,-5 ; -0.99,5 -0.45,5 ; -0.45,-5 -0.325,-5 cw(c0,-5) 0.325,-5 0.45,-5 ; -0.45,5 -0.325,5 ccw(c0,5) 0.325,5 0.45,5 ; 0.45,-5 0.99,-5 ; 0.45,5 0.99,5 ; 0.99,-5 1.115,-5 cw(c1.44,-5) 1.765,-5 1.89,-5 ; 0.99,5 1.115,5 ccw(c1.44,5) 1.765,5 1.89,5 ; 1.89,-5 2.43,-5 ; 1.89,5 2.43,5 ; 2.43,-5 2.555,-5 cw(c2.88,-5) 3.205,-5 3.33,-5 ; 2.43,5 2.555,5 ccw(c2.88,5) 3.205,5 3.33,5 ; 3.33,-5 3.45,-5 3.45,-4 ; 3.33,5 3.45,5 3.45,4 ; 3.45,-4 3.45,4 ; -2.016,-2.222 -1.958,-2.28 -1.205,-1.648 -0.957,-0.245 -1.249,0 -1.69,-0.37 -2.016,-2.222 ; -1.78,-2.458 -1.044,-1.84 0.426,-1.84 0.955,-2.47 0.886,-2.54 -1.698,-2.54 -1.78,-2.458 ; -1.537,0.496 -1.144,0.089 -0.856,0.33 -0.618,1.679 -1.133,2.293 -1.239,2.186 -1.537,0.496 ; -0.955,2.47 -0.886,2.54 1.749,2.54 1.797,2.472 1.044,1.84 -0.426,1.84 -0.955,2.47 ; -0.938,0 -0.521,-0.35 0.645,-0.35 1.062,0 0.645,0.35 -0.521,0.35 -0.938,0 ; 0.618,-1.679 0.834,-0.452 1.251,-0.102 1.563,-0.35 1.239,-2.186 1.133,-2.293 0.618,-1.679 ; 0.973,0.335 1.205,1.648 1.941,2.266 2.008,2.171 1.717,0.524 1.283,0.076 0.973,0.335
  text ".Designator" at -2.5,2.9 h1.6
13-SMDTopOverlay:
  lines w0.2: -0.6,-0.7 0.6,-0.7 ; -0.6,0.7 0.6,0.7
3D body "Kingbright_ACSX02-41.STEP": height 3, standoff -0.05, extent -3.45,-5 3.45,5

## Kingbright_ACSX02-41_G [mm] "Kingbright, SMD 1 Digit, 7 Segment Display, Green"
height 4
pads (10):
  rect 0.8x2.8 smd: 1(-2.88,-5) 2(-1.44,-5) 3(0,-5) 4(1.44,-5) 5(2.88,-5) 6(2.88,5) 7(1.44,5) 8(0,5) 9(-1.44,5) 10(-2.88,5)
TopOverlay:
  circle w0.254: c2.5,-2.1 r0.316
  lines w0.2: -3.5,-5.2 -3.7,-5.2 -3.7,0 -3.7,5.2 -3.5,5.2 ; -2.2,-5.2 -2.1,-5.2 ; -2.2,5.2 -2.1,5.2 ; -0.8,-5.2 -0.7,-5.2 ; -0.8,5.2 -0.7,5.2 ; 0.6,-1.6 1.1,-2.2 1.2,-2.2 1.6,-0.4 1.3,-0.1 0.8,-0.5 0.6,-1.5 ; 0.7,-5.2 0.8,-5.2 ; 0.7,5.2 0.8,5.2 ; 2.1,-5.2 2.2,-5.2 ; 2.1,5.2 2.2,5.2 ; 3.5,-5.2 3.7,-5.2 3.7,0 3.7,5.2 3.5,5.2 ; -2.1,-2.1 -1.7,-0.4 -1.2,0 -1,-0.3 -1.3,-1.7 -2,-2.2 -2.1,-2.1 ; -1.8,-2.5 -1.1,-1.9 0.4,-1.9 0.9,-2.4 0.8,-2.5 -1.8,-2.5 ; -1.5,0.6 -1.2,0.1 -0.9,0.4 -0.6,1.6 -1.2,2.2 -1.5,0.6 ; -0.9,0 -0.6,0.3 0.6,0.3 1,0 0.7,-0.3 -0.5,-0.3 -0.9,0 ; -0.9,2.5 -0.4,1.9 1,1.9 1.6,2.4 1.6,2.5 -0.9,2.5 ; 1,0.3 1.3,1.6 1.9,2.2 2,2.2 1.7,0.5 1.4,0.2 1,0.3
2-TopCompOutl:
  circle w0.05: c2.462,-2.14 r0.4
  lines w0.05: -3.33,-4 -3.33,-5 ; -3.33,4 -3.33,5 ; -2.43,-4 -2.43,-5 ; -2.43,4 -2.43,5 ; -1.89,-4 -1.89,-5 ; -1.89,4 -1.89,5 ; -0.99,-4 -0.99,-5 ; -0.99,4 -0.99,5 ; -0.45,-4 -0.45,-5 ; -0.45,4 -0.45,5 ; 0.45,-4 0.45,-5 ; 0.45,4 0.45,5 ; 0.99,-4 0.99,-5 ; 0.99,4 0.99,5 ; 1.89,-4 1.89,-5 ; 1.89,4 1.89,5 ; 2.43,-4 2.43,-5 ; 2.43,4 2.43,5 ; 3.33,-4 3.33,-5 ; 3.33,4 3.33,5 ; -3.45,-4 3.45,-4 ; -3.45,-4 -3.45,4 ; -3.45,-4 -3.45,-5 -3.33,-5 ; -3.45,4 3.45,4 ; -3.45,4 -3.45,5 -3.33,5 ; -3.33,-5 -3.205,-5 cw(c-2.88,-5) -2.555,-5 -2.43,-5 ; -3.33,5 -3.205,5 ccw(c-2.88,5) -2.555,5 -2.43,5 ; -2.43,-5 -1.89,-5 ; -2.43,5 -1.89,5 ; -1.89,-5 -1.765,-5 cw(c-1.44,-5) -1.115,-5 -0.99,-5 ; -1.89,5 -1.765,5 ccw(c-1.44,5) -1.115,5 -0.99,5 ; -0.99,-5 -0.45,-5 ; -0.99,5 -0.45,5 ; -0.45,-5 -0.325,-5 cw(c0,-5) 0.325,-5 0.45,-5 ; -0.45,5 -0.325,5 ccw(c0,5) 0.325,5 0.45,5 ; 0.45,-5 0.99,-5 ; 0.45,5 0.99,5 ; 0.99,-5 1.115,-5 cw(c1.44,-5) 1.765,-5 1.89,-5 ; 0.99,5 1.115,5 ccw(c1.44,5) 1.765,5 1.89,5 ; 1.89,-5 2.43,-5 ; 1.89,5 2.43,5 ; 2.43,-5 2.555,-5 cw(c2.88,-5) 3.205,-5 3.33,-5 ; 2.43,5 2.555,5 ccw(c2.88,5) 3.205,5 3.33,5 ; 3.33,-5 3.45,-5 3.45,-4 ; 3.33,5 3.45,5 3.45,4 ; 3.45,-4 3.45,4 ; -2.016,-2.222 -1.958,-2.28 -1.205,-1.648 -0.957,-0.245 -1.249,0 -1.69,-0.37 -2.016,-2.222 ; -1.78,-2.458 -1.044,-1.84 0.426,-1.84 0.955,-2.47 0.886,-2.54 -1.698,-2.54 -1.78,-2.458 ; -1.537,0.496 -1.144,0.089 -0.856,0.33 -0.618,1.679 -1.133,2.293 -1.239,2.186 -1.537,0.496 ; -0.955,2.47 -0.886,2.54 1.749,2.54 1.797,2.472 1.044,1.84 -0.426,1.84 -0.955,2.47 ; -0.938,0 -0.521,-0.35 0.645,-0.35 1.062,0 0.645,0.35 -0.521,0.35 -0.938,0 ; 0.618,-1.679 0.834,-0.452 1.251,-0.102 1.563,-0.35 1.239,-2.186 1.133,-2.293 0.618,-1.679 ; 0.973,0.335 1.205,1.648 1.941,2.266 2.008,2.171 1.717,0.524 1.283,0.076 0.973,0.335
4-TopCourty:
  circle w0.1: c0,0 r0.4
  lines w0.05: -4,-6.5 -4,6.5 4,6.5 4,-6.5 -4,-6.5
  lines w0.1: -0.55,0 0.55,0 ; 0,-0.575 0,0.575
7-TopAssy:
  circle w0.05: c2.462,-2.14 r0.4
  lines w0.05: -3.33,-4 -3.33,-5 ; -3.33,4 -3.33,5 ; -2.43,-4 -2.43,-5 ; -2.43,4 -2.43,5 ; -1.89,-4 -1.89,-5 ; -1.89,4 -1.89,5 ; -0.99,-4 -0.99,-5 ; -0.99,4 -0.99,5 ; -0.45,-4 -0.45,-5 ; -0.45,4 -0.45,5 ; 0.45,-4 0.45,-5 ; 0.45,4 0.45,5 ; 0.99,-4 0.99,-5 ; 0.99,4 0.99,5 ; 1.89,-4 1.89,-5 ; 1.89,4 1.89,5 ; 2.43,-4 2.43,-5 ; 2.43,4 2.43,5 ; 3.33,-4 3.33,-5 ; 3.33,4 3.33,5 ; -3.45,-4 3.45,-4 ; -3.45,-4 -3.45,4 ; -3.45,-4 -3.45,-5 -3.33,-5 ; -3.45,4 3.45,4 ; -3.45,4 -3.45,5 -3.33,5 ; -3.33,-5 -3.205,-5 cw(c-2.88,-5) -2.555,-5 -2.43,-5 ; -3.33,5 -3.205,5 ccw(c-2.88,5) -2.555,5 -2.43,5 ; -2.43,-5 -1.89,-5 ; -2.43,5 -1.89,5 ; -1.89,-5 -1.765,-5 cw(c-1.44,-5) -1.115,-5 -0.99,-5 ; -1.89,5 -1.765,5 ccw(c-1.44,5) -1.115,5 -0.99,5 ; -0.99,-5 -0.45,-5 ; -0.99,5 -0.45,5 ; -0.45,-5 -0.325,-5 cw(c0,-5) 0.325,-5 0.45,-5 ; -0.45,5 -0.325,5 ccw(c0,5) 0.325,5 0.45,5 ; 0.45,-5 0.99,-5 ; 0.45,5 0.99,5 ; 0.99,-5 1.115,-5 cw(c1.44,-5) 1.765,-5 1.89,-5 ; 0.99,5 1.115,5 ccw(c1.44,5) 1.765,5 1.89,5 ; 1.89,-5 2.43,-5 ; 1.89,5 2.43,5 ; 2.43,-5 2.555,-5 cw(c2.88,-5) 3.205,-5 3.33,-5 ; 2.43,5 2.555,5 ccw(c2.88,5) 3.205,5 3.33,5 ; 3.33,-5 3.45,-5 3.45,-4 ; 3.33,5 3.45,5 3.45,4 ; 3.45,-4 3.45,4 ; -2.016,-2.222 -1.958,-2.28 -1.205,-1.648 -0.957,-0.245 -1.249,0 -1.69,-0.37 -2.016,-2.222 ; -1.78,-2.458 -1.044,-1.84 0.426,-1.84 0.955,-2.47 0.886,-2.54 -1.698,-2.54 -1.78,-2.458 ; -1.537,0.496 -1.144,0.089 -0.856,0.33 -0.618,1.679 -1.133,2.293 -1.239,2.186 -1.537,0.496 ; -0.955,2.47 -0.886,2.54 1.749,2.54 1.797,2.472 1.044,1.84 -0.426,1.84 -0.955,2.47 ; -0.938,0 -0.521,-0.35 0.645,-0.35 1.062,0 0.645,0.35 -0.521,0.35 -0.938,0 ; 0.618,-1.679 0.834,-0.452 1.251,-0.102 1.563,-0.35 1.239,-2.186 1.133,-2.293 0.618,-1.679 ; 0.973,0.335 1.205,1.648 1.941,2.266 2.008,2.171 1.717,0.524 1.283,0.076 0.973,0.335
  text ".Designator" at -2.5,2.9 h1.6
13-SMDTopOverlay:
  lines w0.2: -0.6,-0.7 0.6,-0.7 ; -0.6,0.7 0.6,0.7
3D body "Kingbright_ACSX02-41_G.STEP": height 3, standoff -0.05, extent -3.45,-5 3.45,5

## LED [mm]
pads (2):
  oval 1.8x1.6 hole 0.8: 1(0,0) 2(0,-2.54)
TopOverlay:
  lines w0.2: -1.087,-3.521 cw(c0,-1.27) 1.087,-3.521 ; -1.067,-3.531 1.067,-3.531
2-TopCompOutl:
  circle w0.1: c0,-1.27 r2.5
  lines w0.1: -1.454,-3.894 cw(c0,-1.27) 1.408,-3.919 ; -1.425,-3.925 1.4,-3.925
4-TopCourty:
  circle w0.1: c0,0 r0.35
  lines w0.05: -3.15,-4.175 3.2,-4.175 3.2,1.925 -3.15,1.925 -3.15,-4.175
  lines w0.1: -0.525,0 0.525,0 ; 0,-0.525 0,0.525
7-TopAssy:
  circle w0.1: c0,-1.27 r2.5
  lines w0.1: -1.454,-3.894 cw(c0,-1.27) 1.408,-3.919 ; -1.425,-3.925 1.4,-3.925
  text ".Designator" at -2.2,2.075 h2.2